# Altium footprint library 00.PcbLib: 150 footprints (part 5 of 10)
Each footprint in its own frame and in the unit in brackets; x right, y up, seen from the top. Pads: shape width x height; smd on the part's side, far side on the other; paste and mask are expansions set on the pad; w line width, h text height; cw(c..) or ccw(c..) is an arc to the next point about the centre after c.
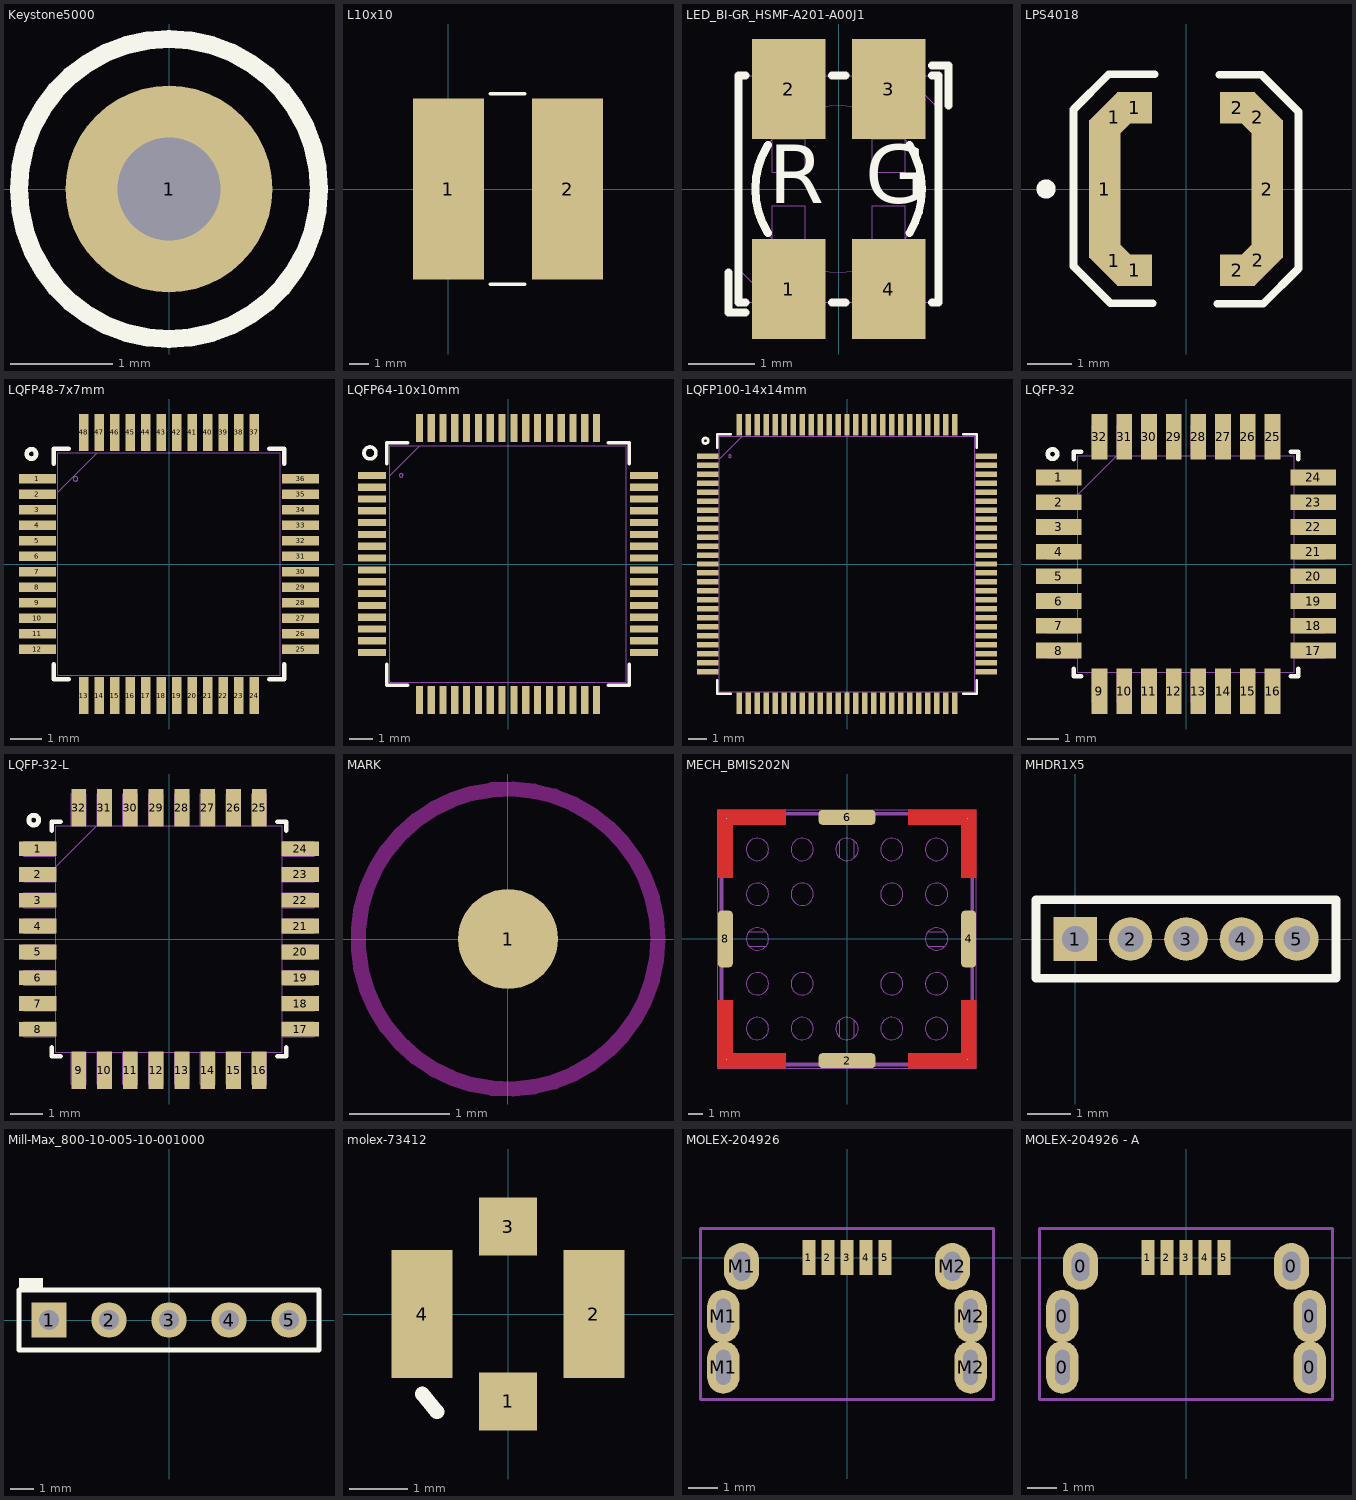
[diagram p4: the footprints below, top view; thin cyan lines are the x and y axes]

## Keystone5000 [mil]
pads (1):
  round 80 hole 40: 1(0,0)
Top Overlay:
  circle w7: c0,0 r58
3D body "Keystone_5000.stp": height 181.97, standoff -118.11, extent -49,-49 49.04,49.24

## L10x10 [mm]
pads (2):
  rect 3.75x9.5 smd: 1(0,0) 2(6.25,0)
Top Overlay:
  lines w0.2: 2.2,-5 4,-5 ; 2.2,5 4,5

## LED_BI-GR_HSMF-A201-A00J1 [mm]
pads (4):
  rect 1.1x1.5 smd mask+0.05: 1(-0.75,-1.5) 2(-0.75,1.5) 3(0.75,1.5) 4(0.75,-1.5)
Top Overlay:
  lines w0.12: -1.65,-1.25 -1.65,-1.85 -1.4,-1.85 ; -1.4,-1.7 -1.5,-1.7 -1.5,1.7 -1.4,1.7 ; -1.063,-0.658 cw(c0,0) -1.063,0.658 ; -0.1,-1.7 0.1,-1.7 ; -0.1,1.7 0.1,1.7 ; 1.063,-0.658 ccw(c0,0) 1.063,0.658 ; 1.4,-1.7 1.5,-1.7 1.5,1.7 1.4,1.7 ; 1.4,1.85 1.65,1.85 1.65,1.25
  text "R" at -1.05,-0.5 h1.5
  text "G" at 0.4,-0.5 h1.5
Bottom 3D Body:
  circle w0.01: c0,0 r1.25
  lines w0.01: -1.5,-1.2 -1,-1.7 ; -1.15,-1.7 -1.15,-1.85 -0.35,-1.85 -0.35,-1.7 ; -1.15,1.7 -1.15,1.75 -1.15,1.85 -0.35,1.85 -0.35,1.75 -0.35,1.7 ; 0.35,-1.7 0.35,-1.75 0.35,-1.85 1.15,-1.85 1.15,-1.75 1.15,-1.7 ; 0.35,1.7 0.35,1.85 1.15,1.85 1.15,1.7 ; 1,1.7 1.5,1.2 ; -1.5,-1.7 1.5,-1.7 1.5,1.7 -1.5,1.7 -1.5,-1.7 ; -1,-0.75 -1,-0.25 -0.5,-0.25 -0.5,-0.75 -1,-0.75 ; -1,0.25 -1,0.75 -0.5,0.75 -0.5,0.25 -1,0.25 ; 0.5,-0.75 1,-0.75 1,-0.25 0.5,-0.25 0.5,-0.75 ; 0.5,0.25 0.5,0.75 1,0.75 1,0.25 0.5,0.25
  text "A1" at -1.5,0.95 h0.75
  text "C2" at -0.075,0.925 h0.75
  text "A2" at -0.025,-1.9 h0.75
  text "'.Designator'" at 2.095,-1.76 h0.75
  text "R" at -1.05,-0.525 h1.5
  text "C1" at -1.45,-1.925 h0.75
  text "G" at 0.4,-0.525 h1.5
3D body: height 2.1, standoff 0, extent -1.505,-1.855 1.505,1.855

## LPS4018 [mil]
pads (10):
  rect 28x123 smd: 1(-72.5,0) 2(72.5,0)
  rect 35.5x28 smd rot 135: 1(-64,-64) 2(64,64)
  rect 35.5x28 smd rot 45: 1(-64,64) 2(64.5,-63.5)
  rect 31.5x28 smd: 1(-46,-72.5) 1(-46,72.5) 2(46,-72.5) 2(46,72.5)
Top Overlay:
  circle w10: c-125,0 r3.54
  lines w7: -30,-102 -67.5,-102 -100.5,-69 -100.5,71 -69,102.5 -28,102.5 ; 28,-102.5 69,-102.5 100.5,-71 100.5,69 67.5,102 30,102
3D body "LPS4018.STEP": height 71.47, standoff 0.6, extent -80.82,-80.82 80.83,80.83

## LQFP48-7x7mm [mm]
pads (48):
  rect 1.194x0.305 smd paste+0 mask+0: 1(-4.25,2.75) 2(-4.25,2.25) 3(-4.25,1.75) 4(-4.25,1.25) 5(-4.25,0.75) 6(-4.25,0.25) 7(-4.25,-0.25) 8(-4.25,-0.75) 9(-4.25,-1.25) 10(-4.25,-1.75) 11(-4.25,-2.25) 12(-4.25,-2.75) 25(4.25,-2.75) 26(4.25,-2.25) 27(4.25,-1.75) 28(4.25,-1.25) 29(4.25,-0.75) 30(4.25,-0.25) 31(4.25,0.25) 32(4.25,0.75) 33(4.25,1.25) 34(4.25,1.75) 35(4.25,2.25) 36(4.25,2.75)
  rect 0.305x1.194 smd paste+0 mask+0: 13(-2.75,-4.25) 14(-2.25,-4.25) 15(-1.75,-4.25) 16(-1.25,-4.25) 17(-0.75,-4.25) 18(-0.25,-4.25) 19(0.25,-4.25) 20(0.75,-4.25) 21(1.25,-4.25) 22(1.75,-4.25) 23(2.25,-4.25) 24(2.75,-4.25) 37(2.75,4.25) 38(2.25,4.25) 39(1.75,4.25) 40(1.25,4.25) 41(0.75,4.25) 42(0.25,4.25) 43(-0.25,4.25) 44(-0.75,4.25) 45(-1.25,4.25) 46(-1.75,4.25) 47(-2.25,4.25) 48(-2.75,4.25)
Top Overlay:
  circle w0.152: c-4.445,3.556 r0.152
  lines w0.152: -3.721,-3.235 -3.721,-3.721 -3.235,-3.721 ; -3.721,3.235 -3.721,3.721 -3.235,3.721 ; 3.235,-3.721 3.721,-3.721 3.721,-3.235 ; 3.235,3.721 3.721,3.721 3.721,3.235
Top Component Outline (Mech100):
  circle w0: c-3.018,2.75 r0.076
  lines w0.025: -3.594,2.324 -2.324,3.594 ; -3.594,-3.594 -3.594,3.594 3.594,3.594 3.594,-3.594 -3.594,-3.594
3D body "LQFP48-7x7mm.step": height 1.6, standoff 0, extent -4.497,-4.497 4.497,4.497

## LQFP64-10x10mm [mm]
pads (64):
  rect 1.194x0.305 smd paste+0 mask+0: 1(-5.75,3.75) 2(-5.75,3.25) 3(-5.75,2.75) 4(-5.75,2.25) 5(-5.75,1.75) 6(-5.75,1.25) 7(-5.75,0.75) 8(-5.75,0.25) 9(-5.75,-0.25) 10(-5.75,-0.75) 11(-5.75,-1.25) 12(-5.75,-1.75) 13(-5.75,-2.25) 14(-5.75,-2.75) 15(-5.75,-3.25) 16(-5.75,-3.75) 33(5.75,-3.75) 34(5.75,-3.25) 35(5.75,-2.75) 36(5.75,-2.25) 37(5.75,-1.75) 38(5.75,-1.25) 39(5.75,-0.75) 40(5.75,-0.25) 41(5.75,0.25) 42(5.75,0.75) 43(5.75,1.25) 44(5.75,1.75) 45(5.75,2.25) 46(5.75,2.75) 47(5.75,3.25) 48(5.75,3.75)
  rect 0.305x1.194 smd paste+0 mask+0: 17(-3.75,-5.75) 18(-3.25,-5.75) 19(-2.75,-5.75) 20(-2.25,-5.75) 21(-1.75,-5.75) 22(-1.25,-5.75) 23(-0.75,-5.75) 24(-0.25,-5.75) 25(0.25,-5.75) 26(0.75,-5.75) 27(1.25,-5.75) 28(1.75,-5.75) 29(2.25,-5.75) 30(2.75,-5.75) 31(3.25,-5.75) 32(3.75,-5.75) 49(3.75,5.75) 50(3.25,5.75) 51(2.75,5.75) 52(2.25,5.75) 53(1.75,5.75) 54(1.25,5.75) 55(0.75,5.75) 56(0.25,5.75) 57(-0.25,5.75) 58(-0.75,5.75) 59(-1.25,5.75) 60(-1.75,5.75) 61(-2.25,5.75) 62(-2.75,5.75) 63(-3.25,5.75) 64(-3.75,5.75)
Top Overlay:
  circle w0.152: c-5.842,4.699 r0.254
  lines w0.152: -5.131,-4.234 -5.131,-5.131 -4.234,-5.131 ; -5.131,4.234 -5.131,5.131 -4.234,5.131 ; 4.234,-5.131 5.131,-5.131 5.131,-4.234 ; 4.234,5.131 5.131,5.131 5.131,4.234
Top Component Outline (Mech100):
  circle w0: c-4.518,3.75 r0.076
  lines w0.025: -5.004,3.734 -3.734,5.004 ; -5.004,-5.004 -5.004,5.004 5.004,5.004 5.004,-5.004 -5.004,-5.004
3D body "LQFP64-10x10mm.step": height 1.6, standoff 0, extent -5.997,-5.997 5.997,5.997

## LQFP100-14x14mm [mil]
pads (100):
  rect 47x12 smd paste+0 mask+0: 1(-305.12,236.22) 2(-305.12,216.54) 3(-305.12,196.85) 4(-305.12,177.17) 5(-305.12,157.48) 6(-305.12,137.8) 7(-305.12,118.11) 8(-305.12,98.43) 9(-305.12,78.74) 10(-305.12,59.06) 11(-305.12,39.37) 12(-305.12,19.69) 13(-305.12,0) 14(-305.12,-19.68) 15(-305.12,-39.37) 16(-305.12,-59.06) 17(-305.12,-78.74) 18(-305.12,-98.43) 19(-305.12,-118.11) 20(-305.12,-137.8) 21(-305.12,-157.48) 22(-305.12,-177.17) 23(-305.12,-196.85) 24(-305.12,-216.54) 25(-305.12,-236.22) 51(305.12,-236.22) 52(305.12,-216.54) 53(305.12,-196.85) 54(305.12,-177.17) 55(305.12,-157.48) 56(305.12,-137.8) 57(305.12,-118.11) 58(305.12,-98.43) 59(305.12,-78.74) 60(305.12,-59.06) 61(305.12,-39.37) 62(305.12,-19.68) 63(305.12,0) 64(305.12,19.68) 65(305.12,39.37) 66(305.12,59.06) 67(305.12,78.74) 68(305.12,98.43) 69(305.12,118.11) 70(305.12,137.8) 71(305.12,157.48) 72(305.12,177.17) 73(305.12,196.85) 74(305.12,216.54) 75(305.12,236.22)
  rect 12x47 smd paste+0 mask+0: 26(-236.22,-305.12) 27(-216.54,-305.12) 28(-196.85,-305.12) 29(-177.17,-305.12) 30(-157.48,-305.12) 31(-137.8,-305.12) 32(-118.11,-305.12) 33(-98.43,-305.12) 34(-78.74,-305.12) 35(-59.06,-305.12) 36(-39.37,-305.12) 37(-19.68,-305.12) 38(0,-305.12) 39(19.68,-305.12) 40(39.37,-305.12) 41(59.06,-305.12) 42(78.74,-305.12) 43(98.43,-305.12) 44(118.11,-305.12) 45(137.8,-305.12) 46(157.48,-305.12) 47(177.17,-305.12) 48(196.85,-305.12) 49(216.54,-305.12) 50(236.22,-305.12) 76(236.22,305.12) 77(216.54,305.12) 78(196.85,305.12) 79(177.17,305.12) 80(157.48,305.12) 81(137.8,305.12) 82(118.11,305.12) 83(98.43,305.12) 84(78.74,305.12) 85(59.06,305.12) 86(39.37,305.12) 87(19.68,305.12) 88(0,305.12) 89(-19.68,305.12) 90(-39.37,305.12) 91(-59.06,305.12) 92(-78.74,305.12) 93(-98.43,305.12) 94(-118.11,305.12) 95(-137.8,305.12) 96(-157.48,305.12) 97(-177.17,305.12) 98(-196.85,305.12) 99(-216.54,305.12) 100(-236.22,305.12)
Top Overlay:
  circle w6: c-310,270 r6
  lines w6: -284.5,-255.32 -284.5,-284.5 -255.32,-284.5 ; -284.5,255.32 -284.5,284.5 -255.32,284.5 ; 255.32,-284.5 284.5,-284.5 284.5,-255.32 ; 255.32,284.5 284.5,284.5 284.5,255.32
Top Component Outline (Mech100):
  circle w0: c-256.62,236.22 r3
  lines w1: -279.5,229.5 -229.5,279.5 ; -279.5,-279.5 279.5,-279.5 279.5,279.5 -279.5,279.5 -279.5,-279.5
3D body "LQFP100-14x14mm.step": height 63.11, standoff 0, extent -314.83,-314.84 314.85,314.85

## LQFP-32 [mil]
pads (32):
  rect 58x20 smd paste+0 mask+0: 1(-162,110.24) 2(-162,78.74) 3(-162,47.24) 4(-162,15.75) 5(-162,-15.75) 6(-162,-47.24) 7(-162,-78.74) 8(-162,-110.24) 17(162,-110.24) 18(162,-78.74) 19(162,-47.24) 20(162,-15.75) 21(162,15.75) 22(162,47.24) 23(162,78.74) 24(162,110.24)
  rect 20x58 smd paste+0 mask+0: 9(-110.24,-162) 10(-78.74,-162) 11(-47.24,-162) 12(-15.75,-162) 13(15.75,-162) 14(47.24,-162) 15(78.74,-162) 16(110.24,-162) 25(110.24,162) 26(78.74,162) 27(47.24,162) 28(15.75,162) 29(-15.75,162) 30(-47.24,162) 31(-78.74,162) 32(-110.24,162)
Top Overlay:
  circle w6: c-170,140 r6
  lines w6: -143,-133.34 -143,-143 -133.34,-143 ; -143,133.34 -143,143 -133.34,143 ; 133.34,-143 143,-143 143,-133.34 ; 133.34,143 143,143 143,133.34
Top Component Outline (Mech100):
  lines w1: -138,88 -88,138 ; -177,-119.24 -177,-101.24 -138,-101.24 -138,-119.24 -177,-119.24 ; -177,-87.74 -177,-69.74 -138,-69.74 -138,-87.74 -177,-87.74 ; -177,-56.24 -177,-38.24 -138,-38.24 -138,-56.24 -177,-56.24 ; -177,-24.75 -177,-6.75 -138,-6.75 -138,-24.75 -177,-24.75 ; -177,6.75 -177,24.75 -138,24.75 -138,6.75 -177,6.75 ; -177,38.24 -177,56.24 -138,56.24 -138,38.24 -177,38.24 ; -177,69.74 -177,87.74 -138,87.74 -138,69.74 -177,69.74 ; -177,101.24 -177,119.24 -138,119.24 -138,101.24 -177,101.24 ; -138,-138 -138,138 138,138 138,-138 -138,-138 ; -119.24,-177 -101.24,-177 -101.24,-138 -119.24,-138 -119.24,-177 ; -119.24,138 -101.24,138 -101.24,177 -119.24,177 -119.24,138 ; -87.74,-177 -87.74,-138 -69.74,-138 -69.74,-177 -87.74,-177 ; -87.74,138 -87.74,177 -69.74,177 -69.74,138 -87.74,138 ; -56.24,-177 -38.24,-177 -38.24,-138 -56.24,-138 -56.24,-177 ; -56.24,138 -38.24,138 -38.24,177 -56.24,177 -56.24,138 ; -24.75,-177 -6.75,-177 -6.75,-138 -24.75,-138 -24.75,-177 ; -24.75,138 -6.75,138 -6.75,177 -24.75,177 -24.75,138 ; 6.75,-177 24.75,-177 24.75,-138 6.75,-138 6.75,-177 ; 6.75,138 24.75,138 24.75,177 6.75,177 6.75,138 ; 38.24,-177 56.24,-177 56.24,-138 38.24,-138 38.24,-177 ; 38.24,138 56.24,138 56.24,177 38.24,177 38.24,138 ; 69.74,-177 69.74,-138 87.74,-138 87.74,-177 69.74,-177 ; 69.74,138 69.74,177 87.74,177 87.74,138 69.74,138 ; 101.24,-177 119.24,-177 119.24,-138 101.24,-138 101.24,-177 ; 101.24,138 119.24,138 119.24,177 101.24,177 101.24,138 ; 138,-119.24 138,-101.24 177,-101.24 177,-119.24 138,-119.24 ; 138,-87.74 138,-69.74 177,-69.74 177,-87.74 138,-87.74 ; 138,-56.24 138,-38.24 177,-38.24 177,-56.24 138,-56.24 ; 138,-24.75 138,-6.75 177,-6.75 177,-24.75 138,-24.75 ; 138,6.75 138,24.75 177,24.75 177,6.75 138,6.75 ; 138,38.24 138,56.24 177,56.24 177,38.24 138,38.24 ; 138,69.74 138,87.74 177,87.74 177,69.74 138,69.74 ; 138,101.24 138,119.24 177,119.24 177,101.24 138,101.24
3D body "LQFP-32.step": height 63.11, standoff 0, extent -177,-177.01 177.01,177.01

## LQFP-32-L [mil]
pads (32):
  rect 46x18 smd paste+0 mask+0: 1(-160,110.24) 2(-160,78.74) 3(-160,47.24) 4(-160,15.75) 5(-160,-15.75) 6(-160,-47.24) 7(-160,-78.74) 8(-160,-110.24) 17(160,-110.24) 18(160,-78.74) 19(160,-47.24) 20(160,-15.75) 21(160,15.75) 22(160,47.24) 23(160,78.74) 24(160,110.24)
  rect 18x46 smd paste+0 mask+0: 9(-110.24,-160) 10(-78.74,-160) 11(-47.24,-160) 12(-15.75,-160) 13(15.75,-160) 14(47.24,-160) 15(78.74,-160) 16(110.24,-160) 25(110.24,160) 26(78.74,160) 27(47.24,160) 28(15.75,160) 29(-15.75,160) 30(-47.24,160) 31(-78.74,160) 32(-110.24,160)
Top Overlay:
  circle w6: c-165,145 r6
  lines w6: -143,-132.34 -143,-143 -132.34,-143 ; -143,132.34 -143,143 -132.34,143 ; 132.34,-143 143,-143 143,-132.34 ; 132.34,143 143,143 143,132.34
Top Component Outline (Mech100):
  lines w1: -138,88 -88,138 ; -177,-119.24 -138,-119.24 -138,-101.24 -177,-101.24 -177,-119.24 ; -177,-87.74 -138,-87.74 -138,-69.74 -177,-69.74 -177,-87.74 ; -177,-56.24 -138,-56.24 -138,-38.24 -177,-38.24 -177,-56.24 ; -177,-24.75 -138,-24.75 -138,-6.75 -177,-6.75 -177,-24.75 ; -177,6.75 -138,6.75 -138,24.75 -177,24.75 -177,6.75 ; -177,38.24 -138,38.24 -138,56.24 -177,56.24 -177,38.24 ; -177,69.74 -138,69.74 -138,87.74 -177,87.74 -177,69.74 ; -177,101.24 -138,101.24 -138,119.24 -177,119.24 -177,101.24 ; -138,-138 138,-138 138,138 -138,138 -138,-138 ; -119.24,-177 -119.24,-138 -101.24,-138 -101.24,-177 -119.24,-177 ; -119.24,138 -119.24,177 -101.24,177 -101.24,138 -119.24,138 ; -87.74,-177 -69.74,-177 -69.74,-138 -87.74,-138 -87.74,-177 ; -87.74,138 -69.74,138 -69.74,177 -87.74,177 -87.74,138 ; -56.24,-177 -56.24,-138 -38.24,-138 -38.24,-177 -56.24,-177 ; -56.24,138 -56.24,177 -38.24,177 -38.24,138 -56.24,138 ; -24.75,-177 -24.75,-138 -6.75,-138 -6.75,-177 -24.75,-177 ; -24.75,138 -24.75,177 -6.75,177 -6.75,138 -24.75,138 ; 6.75,-177 6.75,-138 24.75,-138 24.75,-177 6.75,-177 ; 6.75,138 6.75,177 24.75,177 24.75,138 6.75,138 ; 38.24,-177 38.24,-138 56.24,-138 56.24,-177 38.24,-177 ; 38.24,138 38.24,177 56.24,177 56.24,138 38.24,138 ; 69.74,-177 87.74,-177 87.74,-138 69.74,-138 69.74,-177 ; 69.74,138 87.74,138 87.74,177 69.74,177 69.74,138 ; 101.24,-177 101.24,-138 119.24,-138 119.24,-177 101.24,-177 ; 101.24,138 101.24,177 119.24,177 119.24,138 101.24,138 ; 138,-119.24 177,-119.24 177,-101.24 138,-101.24 138,-119.24 ; 138,-87.74 177,-87.74 177,-69.74 138,-69.74 138,-87.74 ; 138,-56.24 177,-56.24 177,-38.24 138,-38.24 138,-56.24 ; 138,-24.75 177,-24.75 177,-6.75 138,-6.75 138,-24.75 ; 138,6.75 177,6.75 177,24.75 138,24.75 138,6.75 ; 138,38.24 177,38.24 177,56.24 138,56.24 138,38.24 ; 138,69.74 177,69.74 177,87.74 138,87.74 138,69.74 ; 138,101.24 177,101.24 177,119.24 138,119.24 138,101.24
3D body "LQFP-32.step": height 63.11, standoff 0, extent -177,-177 177.02,177.02

## MARK [mm]
pads (1):
  round 1 smd paste-0.5 mask+1: 1(0,0)
Top Layer keep-out:
  circle w0.152: c0,0 r1.5

## MECH_BMIS202N [mm] "MECH_BMIS202N"
pads (8):
  oct 0.025x0.025 smd: 1(-8.075,-8.075) 3(8.075,-8.075) 5(8.075,8.075) 7(-8.075,8.075)
  rrect50% 3.8x1 smd: 2(0,-8.15) 6(0,8.15)
  rrect50% 1x3.8 smd: 4(8.15,0) 8(-8.15,0)
Top Layer:
  region: 7.65,4.1 8.65,4.1 8.65,8.65 4.1,8.65 4.1,7.65 7.65,7.65
  region: 7.65,4.1 8.65,4.1 8.65,8.65 4.1,8.65 4.1,7.65 7.65,7.65
  region: 4.1,-7.65 4.1,-8.65 8.65,-8.65 8.65,-4.1 7.65,-4.1 7.65,-7.65
  region: 4.1,-7.65 4.1,-8.65 8.65,-8.65 8.65,-4.1 7.65,-4.1 7.65,-7.65
  region: -4.1,7.65 -4.1,8.65 -8.65,8.65 -8.65,4.1 -7.65,4.1 -7.65,7.65
  region: -4.1,7.65 -4.1,8.65 -8.65,8.65 -8.65,4.1 -7.65,4.1 -7.65,7.65
  region: -7.65,-4.1 -8.65,-4.1 -8.65,-8.65 -4.1,-8.65 -4.1,-7.65 -7.65,-7.65
  region: -7.65,-4.1 -8.65,-4.1 -8.65,-8.65 -4.1,-8.65 -4.1,-7.65 -7.65,-7.65
Top Paste:
  region: 7.75,4.2 8.55,4.2 8.55,8.55 4.2,8.55 4.2,7.75 7.75,7.75
  region: 4.2,-7.75 4.2,-8.55 8.55,-8.55 8.55,-4.2 7.75,-4.2 7.75,-7.75
  region: -4.2,7.75 -4.2,8.55 -8.55,8.55 -8.55,4.2 -7.75,4.2 -7.75,7.75
  region: -7.75,-4.2 -8.55,-4.2 -8.55,-8.55 -4.2,-8.55 -4.2,-7.75 -7.75,-7.75
Top Solder:
  region: 7.575,4.025 8.725,4.025 8.725,8.725 4.025,8.725 4.025,7.575 7.575,7.575
  region: 4.025,-7.575 4.025,-8.725 8.725,-8.725 8.725,-4.025 7.575,-4.025 7.575,-7.575
  region: -4.025,7.575 -4.025,8.725 -8.725,8.725 -8.725,4.025 -7.575,4.025 -7.575,7.575
  region: -7.575,-4.025 -8.725,-4.025 -8.725,-8.725 -4.025,-8.725 -4.025,-7.575 -7.575,-7.575
Top 3D Body:
  circle w0.025: c0,6 r0.75
  circle w0.025: c6,6 r0.75
  circle w0.025: c6,0 r0.75
  circle w0.025: c0,-6 r0.75
  circle w0.025: c6,-6 r0.75
  circle w0.025: c-6,6 r0.75
  circle w0.025: c-6,0 r0.75
  circle w0.025: c-6,-6 r0.75
  circle w0.025: c6,3 r0.75
  circle w0.025: c6,-3 r0.75
  circle w0.025: c-6,3 r0.75
  circle w0.025: c-6,-3 r0.75
  circle w0.025: c3,6 r0.75
  circle w0.025: c3,-6 r0.75
  circle w0.025: c-3,6 r0.75
  circle w0.025: c-3,-6 r0.75
  circle w0.025: c3,3 r0.75
  circle w0.025: c3,-3 r0.75
  circle w0.025: c-3,3 r0.75
  circle w0.025: c-3,-3 r0.75
  region: -8.48,-8.28 -8.28,-8.28 -8.28,8.28 -8.48,8.28
  region: 8.28,-8.28 8.48,-8.28 8.48,8.28 8.28,8.28
  region: 8.48,-8.48 8.48,-8.28 -8.48,-8.28 -8.48,-8.48
  region: 8.48,8.28 8.48,8.48 -8.48,8.48 -8.48,8.28
  lines w0.025: -6.559,-0.5 -5.441,-0.5 ; -6.559,0.5 -5.441,0.5 ; -0.5,-6.559 -0.5,-5.441 ; -0.5,5.441 -0.5,6.559 ; 0.5,-6.559 0.5,-5.441 ; 0.5,5.441 0.5,6.559 ; 5.441,-0.5 6.559,-0.5 ; 5.441,0.5 6.559,0.5
Top Component Outline (Mech100):
  lines w0.025: -8.65,-8.65 -8.65,8.65 8.65,8.65 8.65,-8.65 -8.65,-8.65 ; -8.48,-8.48 -8.48,8.48 8.48,8.48 8.48,-8.48 -8.48,-8.48
3D body: height 3.81, standoff 0, extent -8.48,-8.28 -8.28,8.28
3D body: height 3.81, standoff 0, extent 8.28,-8.28 8.48,8.28
3D body: height 3.81, standoff 0, extent -8.48,-8.48 8.48,-8.28
3D body: height 3.81, standoff 0, extent -8.48,8.28 8.48,8.48
3D body: height 3.81, standoff 0, extent -8.48,-8.48 8.48,8.48

## MHDR1X5 [mm]
pads (5):
  rect 1x1 hole 0.6: 1(0,0)
  round 1 hole 0.6: 2(1.27,0) 3(2.54,0) 4(3.81,0) 5(5.08,0)
Top Overlay:
  lines w0.2: -0.9,-0.9 5.98,-0.9 5.98,0.9 -0.9,0.9 -0.9,-0.9

## Mill-Max_800-10-005-10-001000 [mm]
pads (5):
  rect 1.5x1.5 hole 0.85: 1(-5.08,0)
  round 1.5 hole 0.85: 2(-2.54,0) 3(0,0) 4(2.54,0) 5(5.08,0)
Top Overlay:
  rectangle: -6.35,1.27 -5.334,1.778
  lines w0.203: -6.35,-1.27 6.35,-1.27 6.35,1.27 -6.35,1.27 -6.35,-1.27
3D body: height 8.13, standoff 0, extent 4.702,-0.38 5.461,0.38
3D body: height 8.13, standoff 0, extent 2.162,-0.38 2.921,0.38
3D body: height 8.13, standoff 0, extent -0.378,-0.38 0.381,0.38
3D body: height 8.13, standoff 0, extent -2.918,-0.38 -2.159,0.38
3D body: height 8.13, standoff 0, extent -5.458,-0.38 -4.699,0.38
3D body: height 0.81, standoff -3, extent 4.778,-0.304 5.385,0.304
3D body: height 0.81, standoff -3, extent 2.238,-0.304 2.845,0.304
3D body: height 0.81, standoff -3, extent -0.302,-0.304 0.305,0.304
3D body: height 0.81, standoff -3, extent -2.842,-0.304 -2.235,0.304
3D body: height 0.81, standoff -3, extent -5.382,-0.304 -4.775,0.304
3D body: height 3.17, standoff 0, extent -6.349,-1.269 6.349,1.269

## molex-73412 [mm]
pads (4):
  rect 1x1 smd: 1(0,-1.5) 3(0,1.5)
  rect 1.05x2.2 smd: 2(1.475,0) 4(-1.475,0)
Top Overlay:
  lines w0.254: -1.473,-1.372 -1.219,-1.676
3D body "734120110.stp": height 1.5, standoff 0.2, extent -1.5,-1.54 1.5,1.54

## MOLEX-204926 [mm]
pads (11):
  rect 0.45x1.2 smd: 1(-1.3,0) 2(-0.65,0) 3(0,0) 4(0.65,0) 5(1.3,0)
  oval 1.1x1.8 hole 1.2 slot 0.5 at 0 deg: M1(-4.225,-3.75) M1(-4.225,-2) M2(4.225,-3.75) M2(4.225,-2)
  oval 1.2x1.6 hole 1 slot 0.6 at 0 deg: M1(-3.6,-0.3) M2(3.6,-0.3)
Top Component Outline (Mech100):
  lines w0.1: -5,-4.85 5,-4.85 5,1 -5,1 -5,-4.85
3D body "2049261103.stp": height 3.95, standoff -1, extent -4.675,-6.67 4.625,0.33

## MOLEX-204926 - A [mm]
pads (11):
  oval 1.1x1.8 hole 1.2 slot 0.5 at 0 deg unplated: 0(-4.225,-3.75) 0(4.225,-3.75)
  oval 1.1x1.8 hole 1.2 slot 0.5 at 0 deg: 0(-4.225,-2) 0(4.225,-2)
  oval 1.2x1.6 hole 1 slot 0.6 at 0 deg: 0(-3.6,-0.3) 0(3.6,-0.3)
  rect 0.45x1.2 smd: 1(-1.3,0) 2(-0.65,0) 3(0,0) 4(0.65,0) 5(1.3,0)
Top Component Outline (Mech4):
  lines w0.1: -5,-4.85 -5,1 5,1 5,-4.85 -5,-4.85
3D body "2049261103.stp": height 3.95, standoff -1, extent -4.675,-6.67 4.625,0.33
3D body: height 0.25, standoff 0, extent 0.838,-2.591 0.838,-2.591
3D body: height 0.25, standoff 0, extent -1.321,-1.88 -1.321,-1.88
3D body: height 0.25, standoff 0, extent 0.584,-2.743 0.584,-2.743